# Altium footprint library mobinbyn-Connector.PcbLib: 82 footprints (part 3 of 6)
Each footprint in its own frame and in the unit in brackets; x right, y up, seen from the top. Pads: shape width x height; smd on the part's side, far side on the other; paste and mask are expansions set on the pad; w line width, h text height; cw(c..) or ccw(c..) is an arc to the next point about the centre after c.
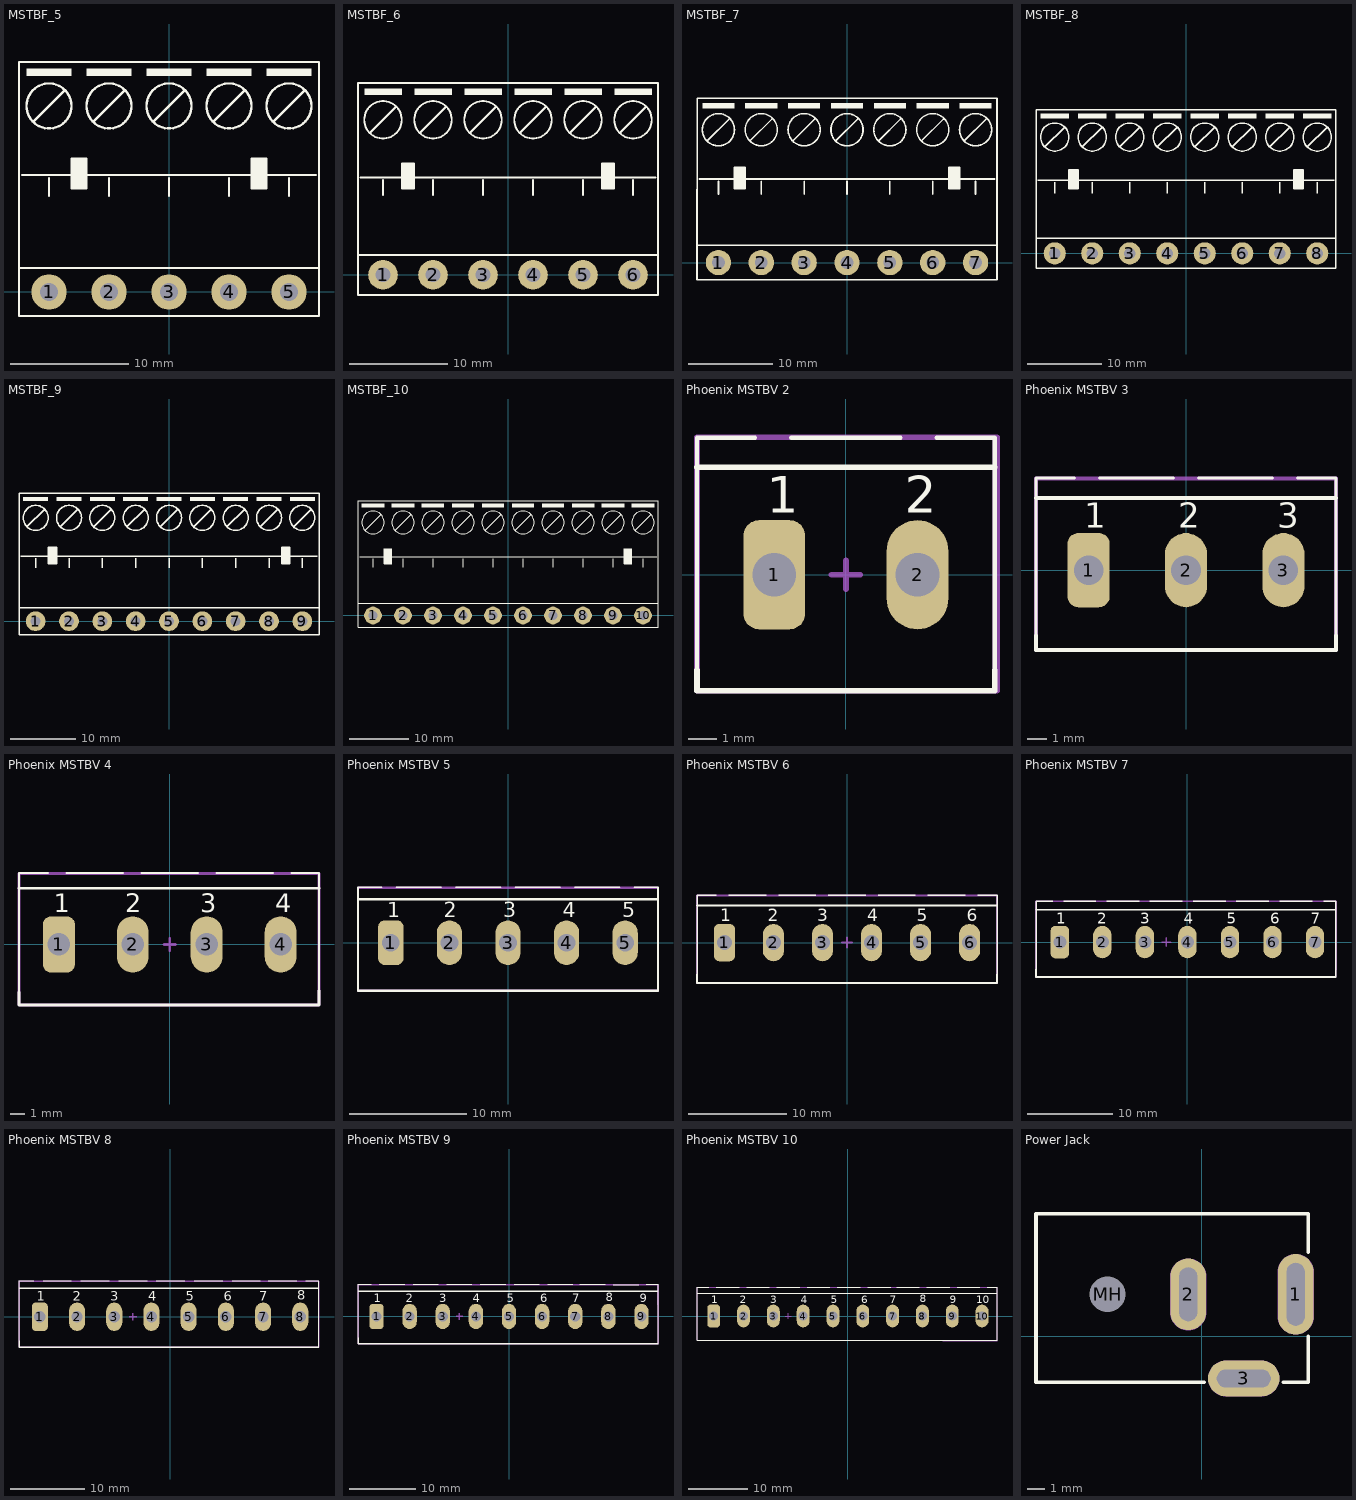
[diagram p2: the footprints below, top view; thin cyan lines are the x and y axes]

## MSTBF_5 [mm] "PHOENIX MSTB 2, 5-G, 5.08mm pitch"
pads (5):
  round 3 hole 1.5: 1(-10.16,0) 2(-5.08,0) 3(0,0) 4(5.08,0) 5(10.16,0)
Top Overlay:
  circle w0.2: c-10.16,15.748 r1.905
  circle w0.2: c-5.08,15.748 r1.905
  circle w0.2: c0,15.748 r1.905
  circle w0.2: c5.08,15.748 r1.905
  circle w0.2: c10.16,15.748 r1.905
  region: 1.905,18.923 -1.905,18.923 -1.905,18.288 1.905,18.288
  region: 6.985,18.923 3.175,18.923 3.175,18.288 6.985,18.288
  region: 12.065,18.923 8.255,18.923 8.255,18.288 12.065,18.288
  region: -8.255,18.923 -12.065,18.923 -12.065,18.288 -8.255,18.288
  region: -3.175,18.923 -6.985,18.923 -6.985,18.288 -3.175,18.288
  region: 8.255,11.303 6.985,11.303 6.985,8.763 8.255,8.763
  rectangle: -8.255,8.763 -6.985,11.303
  lines w0.2: -12.7,2.032 12.7,2.032 ; -12.446,9.906 12.446,9.906 ; -11.43,14.478 -8.89,17.018 ; -10.16,8.128 -10.16,9.618 ; -6.35,14.478 -3.81,17.018 ; -5.08,8.128 -5.08,9.618 ; -1.27,14.478 1.27,17.018 ; 0,8.128 0,9.618 ; 3.81,14.478 6.35,17.018 ; 5.08,8.128 5.08,9.618 ; 8.89,14.478 11.43,17.018 ; 10.16,8.128 10.16,9.618 ; -12.7,-2.032 12.7,-2.032 12.7,19.468 -12.7,19.468 -12.7,-2.032 ; -8.255,8.763 -8.255,11.303 -6.985,11.303 -6.985,8.763 -8.255,8.763 ; 6.985,8.763 6.985,11.303 8.255,11.303 8.255,8.763 6.985,8.763
3D body "PHOENIX_MSTB5w.stp": height 14.47, standoff -0.53, extent -12.7,1 12.7,19.2
3D body "PHOENIX_MSTB5.stp": height 8.6, standoff -3.5, extent -12.5,-2 12.5,10

## MSTBF_6 [mm] "PHOENIX MSTB 2, 5-G, 5.08mm pitch"
pads (6):
  round 3 hole 1.5: 1(-12.7,0) 2(-7.62,0) 3(-2.54,0) 4(2.54,0) 5(7.62,0) 6(12.7,0)
Top Overlay:
  circle w0.2: c-12.7,15.748 r1.905
  circle w0.2: c-7.62,15.748 r1.905
  circle w0.2: c-2.54,15.748 r1.905
  circle w0.2: c2.54,15.748 r1.905
  circle w0.2: c7.62,15.748 r1.905
  circle w0.2: c12.7,15.748 r1.905
  region: 4.445,18.923 0.635,18.923 0.635,18.288 4.445,18.288
  region: 9.525,18.923 5.715,18.923 5.715,18.288 9.525,18.288
  region: 14.605,18.923 10.795,18.923 10.795,18.288 14.605,18.288
  region: -5.715,18.923 -9.525,18.923 -9.525,18.288 -5.715,18.288
  region: -10.795,18.923 -14.605,18.923 -14.605,18.288 -10.795,18.288
  region: -0.635,18.923 -4.445,18.923 -4.445,18.288 -0.635,18.288
  region: 10.795,11.303 9.525,11.303 9.525,8.763 10.795,8.763
  rectangle: -10.795,8.763 -9.525,11.303
  lines w0.2: -15.24,2.032 15.24,2.032 ; -15.24,19.468 -15.24,-2.032 15.24,-2.032 15.24,19.468 -15.21,19.468 ; -14.986,9.906 14.986,9.906 ; -13.97,14.478 -11.43,17.018 ; -12.7,8.128 -12.7,9.618 ; -8.89,14.478 -6.35,17.018 ; -7.62,8.128 -7.62,9.618 ; -3.81,14.478 -1.27,17.018 ; -2.54,8.128 -2.54,9.618 ; 1.27,14.478 3.81,17.018 ; 2.54,8.128 2.54,9.618 ; 6.35,14.478 8.89,17.018 ; 7.62,8.128 7.62,9.618 ; 11.43,14.478 13.97,17.018 ; 12.7,8.128 12.7,9.618 ; -10.795,8.763 -10.795,11.303 -9.525,11.303 -9.525,8.763 -10.795,8.763 ; 9.525,8.763 9.525,11.303 10.795,11.303 10.795,8.763 9.525,8.763
3D body "PHOENIX_MSTB6.stp": height 8.6, standoff -3.5, extent -15,-2 15,10
3D body "PHOENIX_MSTB6W.stp": height 15.07, standoff 0.07, extent -15.18,1 15.3,19.2

## MSTBF_7 [mm] "PHOENIX MSTB 2, 5-G, 5.08mm pitch"
pads (7):
  round 3 hole 1.5: 1(-15.24,0) 2(-10.16,0) 3(-5.08,0) 4(0,0) 5(5.08,0) 6(10.16,0) 7(15.24,0)
Top Overlay:
  circle w0.2: c-15.24,15.748 r1.905
  circle w0.2: c-10.16,15.748 r1.905
  circle w0.2: c-5.08,15.748 r1.905
  circle w0.2: c0,15.748 r1.905
  circle w0.2: c5.08,15.748 r1.905
  circle w0.2: c10.16,15.748 r1.905
  circle w0.2: c15.24,15.748 r1.905
  region: 13.335,11.303 12.065,11.303 12.065,8.763 13.335,8.763
  region: 6.985,18.923 3.175,18.923 3.175,18.288 6.985,18.288
  region: 12.065,18.923 8.255,18.923 8.255,18.288 12.065,18.288
  rectangle: -13.335,8.763 -12.065,11.303
  region: 17.145,18.923 13.335,18.923 13.335,18.288 17.145,18.288
  region: -3.175,18.923 -6.985,18.923 -6.985,18.288 -3.175,18.288
  region: -8.255,18.923 -12.065,18.923 -12.065,18.288 -8.255,18.288
  region: -13.335,18.923 -17.145,18.923 -17.145,18.288 -13.335,18.288
  region: 1.905,18.923 -1.905,18.923 -1.905,18.288 1.905,18.288
  lines w0.2: -17.78,2.032 17.78,2.032 ; -17.526,9.906 17.526,9.906 ; -16.51,14.478 -13.97,17.018 ; -15.24,8.128 -15.24,9.618 ; -11.43,14.478 -8.89,17.018 ; -10.16,8.128 -10.16,9.618 ; -6.35,14.478 -3.81,17.018 ; -5.08,8.128 -5.08,9.618 ; -1.27,14.478 1.27,17.018 ; 0,8.128 0,9.618 ; 3.81,14.478 6.35,17.018 ; 5.08,8.128 5.08,9.618 ; 8.89,14.478 11.43,17.018 ; 10.16,8.128 10.16,9.618 ; 13.97,14.478 16.51,17.018 ; 15.24,8.128 15.24,9.618 ; -17.78,-2.032 17.78,-2.032 17.78,19.468 -17.75,19.468 -17.78,-2.032 ; -13.335,8.763 -12.065,8.763 -12.065,11.303 -13.335,11.303 -13.335,8.763 ; 12.065,8.763 12.065,11.303 13.335,11.303 13.335,8.763 12.065,8.763
3D body "PHOENIX_MSTB6.stp": height 8.6, standoff -3.5, extent -17.5,-2 17.5,10
3D body "PHOENIX_MSTB7W.stp": height 15.07, standoff 0.07, extent -17.86,1 17.7,19.2

## MSTBF_8 [mm] "PHOENIX MSTB 2, 5-G, 5.08mm pitch"
pads (8):
  round 3 hole 1.5: 1(-17.78,0) 2(-12.7,0) 3(-7.62,0) 4(-2.54,0) 5(2.54,0) 6(7.62,0) 7(12.7,0) 8(17.78,0)
Top Overlay:
  circle w0.2: c17.78,15.748 r1.905
  circle w0.2: c12.7,15.748 r1.905
  circle w0.2: c7.62,15.748 r1.905
  circle w0.2: c2.54,15.748 r1.905
  circle w0.2: c-2.54,15.748 r1.905
  circle w0.2: c-7.62,15.748 r1.905
  circle w0.2: c-12.7,15.748 r1.905
  circle w0.2: c-17.78,15.748 r1.905
  region: 15.875,11.303 14.605,11.303 14.605,8.763 15.875,8.763
  region: -14.605,11.303 -15.875,11.303 -15.875,8.763 -14.605,8.763
  region: 4.445,18.923 0.635,18.923 0.635,18.288 4.445,18.288
  region: -15.875,18.923 -19.685,18.923 -19.685,18.288 -15.875,18.288
  region: -10.795,18.923 -14.605,18.923 -14.605,18.288 -10.795,18.288
  region: -5.715,18.923 -9.525,18.923 -9.525,18.288 -5.715,18.288
  region: -0.635,18.923 -4.445,18.923 -4.445,18.288 -0.635,18.288
  region: 19.685,18.923 15.875,18.923 15.875,18.288 19.685,18.288
  region: 14.605,18.923 10.795,18.923 10.795,18.288 14.605,18.288
  region: 9.525,18.923 5.715,18.923 5.715,18.288 9.525,18.288
  lines w0.2: -20.32,2.032 20.32,2.032 ; -20.066,9.906 20.066,9.906 ; -19.05,14.478 -16.51,17.018 ; -17.78,8.128 -17.78,9.618 ; -13.97,14.478 -11.43,17.018 ; -12.7,8.128 -12.7,9.618 ; -8.89,14.478 -6.35,17.018 ; -7.62,8.128 -7.62,9.618 ; -3.81,14.478 -1.27,17.018 ; -2.54,8.128 -2.54,9.618 ; 1.27,14.478 3.81,17.018 ; 2.54,8.128 2.54,9.618 ; 6.35,14.478 8.89,17.018 ; 7.62,8.128 7.62,9.618 ; 11.43,14.478 13.97,17.018 ; 12.7,8.128 12.7,9.618 ; 16.51,14.478 19.05,17.018 ; 17.78,8.128 17.78,9.618 ; -20.32,-2.032 20.32,-2.032 20.32,19.468 -20.32,19.468 -20.32,-2.032 ; -15.875,8.763 -15.875,11.303 -14.605,11.303 -14.605,8.763 -15.875,8.763 ; 14.605,8.763 15.875,8.763 15.875,11.303 14.605,11.303 14.605,8.763
3D body "PHOENIX_MSTB8.stp": height 8.6, standoff -3.5, extent -20,-2 20,10
3D body "PHOENIX_MSTB8W.stp": height 15.07, standoff 0.07, extent -20.34,1 20.3,19.2

## MSTBF_9 [mm] "PHOENIX MSTB 2, 5-G, 5.08mm pitch"
pads (9):
  round 3 hole 1.5: 1(-20.32,0) 2(-15.24,0) 3(-10.16,0) 4(-5.08,0) 5(0,0) 6(5.08,0) 7(10.16,0) 8(15.24,0) 9(20.32,0)
Top Overlay:
  circle w0.2: c-20.32,15.748 r1.905
  circle w0.2: c20.32,15.748 r1.905
  circle w0.2: c15.24,15.748 r1.905
  circle w0.2: c10.16,15.748 r1.905
  circle w0.2: c5.08,15.748 r1.905
  circle w0.2: c0,15.748 r1.905
  circle w0.2: c-5.08,15.748 r1.905
  circle w0.2: c-10.16,15.748 r1.905
  circle w0.2: c-15.24,15.748 r1.905
  region: -18.415,18.923 -22.225,18.923 -22.225,18.288 -18.415,18.288
  region: -17.145,11.303 -18.415,11.303 -18.415,8.763 -17.145,8.763
  region: 18.415,11.303 17.145,11.303 17.145,8.763 18.415,8.763
  region: 6.985,18.923 3.175,18.923 3.175,18.288 6.985,18.288
  region: -13.335,18.923 -17.145,18.923 -17.145,18.288 -13.335,18.288
  region: -8.255,18.923 -12.065,18.923 -12.065,18.288 -8.255,18.288
  region: -3.175,18.923 -6.985,18.923 -6.985,18.288 -3.175,18.288
  region: 1.905,18.923 -1.905,18.923 -1.905,18.288 1.905,18.288
  region: 22.225,18.923 18.415,18.923 18.415,18.288 22.225,18.288
  region: 17.145,18.923 13.335,18.923 13.335,18.288 17.145,18.288
  region: 12.065,18.923 8.255,18.923 8.255,18.288 12.065,18.288
  lines w0.2: -22.86,2.032 22.86,2.032 ; -22.606,9.906 22.606,9.906 ; -21.59,14.478 -19.05,17.018 ; -20.32,8.128 -20.32,9.618 ; -16.51,14.478 -13.97,17.018 ; -15.24,8.128 -15.24,9.618 ; -11.43,14.478 -8.89,17.018 ; -10.16,8.128 -10.16,9.618 ; -6.35,14.478 -3.81,17.018 ; -5.08,8.128 -5.08,9.618 ; -1.27,14.478 1.27,17.018 ; 0,8.128 0,9.618 ; 3.81,14.478 6.35,17.018 ; 5.08,8.128 5.08,9.618 ; 8.89,14.478 11.43,17.018 ; 10.16,8.128 10.16,9.618 ; 13.97,14.478 16.51,17.018 ; 15.24,8.128 15.24,9.618 ; 19.05,14.478 21.59,17.018 ; 20.32,8.128 20.32,9.618 ; -22.86,-2.032 -22.86,19.468 22.86,19.468 22.86,-2.032 -22.86,-2.032 ; -18.415,8.763 -18.415,11.303 -17.145,11.303 -17.145,8.763 -18.415,8.763 ; 17.145,8.763 18.415,8.763 18.415,11.303 17.145,11.303 17.145,8.763
3D body "PHOENIX_MSTB9W.stp": height 15.07, standoff 0.07, extent -22.82,1 22.9,19.2
3D body "PHOENIX_MSTB9.stp": height 8.6, standoff -3.5, extent -22.5,-2 22.5,10

## MSTBF_10 [mm] "PHOENIX MSTB 2, 5-G, 5.08mm pitch"
pads (10):
  round 3 hole 1.5: 1(-22.86,0) 2(-17.78,0) 3(-12.7,0) 4(-7.62,0) 5(-2.54,0) 6(2.54,0) 7(7.62,0) 8(12.7,0) 9(17.78,0) 10(22.86,0)
Top Overlay:
  circle w0.2: c-17.78,15.748 r1.905
  circle w0.2: c-22.86,15.748 r1.905
  circle w0.2: c22.86,15.748 r1.905
  circle w0.2: c17.78,15.748 r1.905
  circle w0.2: c12.7,15.748 r1.905
  circle w0.2: c7.62,15.748 r1.905
  circle w0.2: c2.54,15.748 r1.905
  circle w0.2: c-2.54,15.748 r1.905
  circle w0.2: c-7.62,15.748 r1.905
  circle w0.2: c-12.7,15.748 r1.905
  region: -20.955,18.923 -24.765,18.923 -24.765,18.288 -20.955,18.288
  region: -15.875,18.923 -19.685,18.923 -19.685,18.288 -15.875,18.288
  region: -19.685,11.303 -20.955,11.303 -20.955,8.763 -19.685,8.763
  region: 20.955,11.303 19.685,11.303 19.685,8.763 20.955,8.763
  region: 9.525,18.923 5.715,18.923 5.715,18.288 9.525,18.288
  region: -10.795,18.923 -14.605,18.923 -14.605,18.288 -10.795,18.288
  region: -5.715,18.923 -9.525,18.923 -9.525,18.288 -5.715,18.288
  region: -0.635,18.923 -4.445,18.923 -4.445,18.288 -0.635,18.288
  region: 4.445,18.923 0.635,18.923 0.635,18.288 4.445,18.288
  region: 24.765,18.923 20.955,18.923 20.955,18.288 24.765,18.288
  region: 19.685,18.923 15.875,18.923 15.875,18.288 19.685,18.288
  region: 14.605,18.923 10.795,18.923 10.795,18.288 14.605,18.288
  lines w0.2: -25.4,2.032 25.4,2.032 ; -25.146,9.906 25.146,9.906 ; -24.13,14.478 -21.59,17.018 ; -22.86,8.128 -22.86,9.618 ; -19.05,14.478 -16.51,17.018 ; -17.78,8.128 -17.78,9.618 ; -13.97,14.478 -11.43,17.018 ; -12.7,8.128 -12.7,9.618 ; -8.89,14.478 -6.35,17.018 ; -7.62,8.128 -7.62,9.618 ; -3.81,14.478 -1.27,17.018 ; -2.54,8.128 -2.54,9.618 ; 1.27,14.478 3.81,17.018 ; 2.54,8.128 2.54,9.618 ; 6.35,14.478 8.89,17.018 ; 7.62,8.128 7.62,9.618 ; 11.43,14.478 13.97,17.018 ; 12.7,8.128 12.7,9.618 ; 16.51,14.478 19.05,17.018 ; 17.78,8.128 17.78,9.618 ; 21.59,14.478 24.13,17.018 ; 22.86,8.128 22.86,9.618 ; -25.4,-2.032 -25.4,19.468 25.4,19.468 25.4,-2.032 -25.4,-2.032 ; -20.955,8.763 -20.955,11.303 -19.685,11.303 -19.685,8.763 -20.955,8.763 ; 19.685,8.763 20.955,8.763 20.955,11.303 19.685,11.303 19.685,8.763
3D body "PHOENIX_MSTB10.stp": height 8.6, standoff -3.5, extent -25,-2 25,10
3D body "PHOENIX_MSTB10W.stp": height 15.07, standoff 0.07, extent -25.4,1 25.4,19.2

## Phoenix MSTBV 2 [mil] "Header, Nominal current: 12 A Rated voltage (III/2): 320 V Number of positions: 2 Pitch: 5mm Color: green Contact surface: Tin Assembly: Soldering"
height 338.58
pads (2):
  rrect50% 85x150 hole 60: 1(-98.43,0)
  oval 85x150 hole 60: 2(98.43,0)
Top Overlay:
  lines w6: -204.72,-131.46 -204.72,188.27 -125,188.27 ; -75,188.27 75,188.27 ; 125,188.27 204.72,188.27 204.72,-131.46
  lines w7.87: -204.72,-131.46 -204.72,-159.45 204.72,-159.45 204.72,-131.46 ; -204.72,147.64 204.72,147.64
  text "2" at 80.87,85.24 h50
  text "1" at -109.13,85.24 h50
Mechanical 13:
  lines w6: -204.72,-131.46 -204.72,188.27 -125,188.27 ; -75,188.27 75,188.27 ; 125,188.27 204.72,188.27 204.72,-131.46
Mechanical 15:
  lines w7.87: -19.68,0 19.68,0 ; 0,-19.68 0,19.69 ; -204.72,-159.45 -204.72,188.98 -203.74,188.98 207.68,188.98 207.68,-159.45 -204.72,-159.45
3D body "1753437.stEp": height 473.44, standoff -152.54, extent -196.85,-151.57 196.85,187.01

## Phoenix MSTBV 3 [mil] "Header, Nominal current: 12 A Rated voltage (III/2): 320 V Number of positions: 3 Pitch: 5mm Color: green Contact surface: Tin Assembly: Soldering"
height 338.58
pads (3):
  rrect50% 85x150 hole 60: 1(-196.85,0)
  oval 85x150 hole 60: 2(0,0) 3(196.85,0)
Top Overlay:
  lines w6: -303.15,-131.85 -303.15,186.3 -225,186.3 ; -175,186.3 -25,186.3 ; 25,186.3 175,186.3 ; 225,186.3 303.15,186.3 303.15,-131.85
  lines w7.87: -303.15,-131.85 -303.15,-161.42 303.15,-161.42 303.15,-131.85 ; -303.15,145.67 303.15,145.67
  text "3" at 184.8,85.24 h50
  text "2" at -15.2,85.24 h50
  text "1" at -205.2,85.24 h50
Mechanical 13:
  lines w6: -303.15,-131.85 -303.15,186.3 -225,186.3 ; -175,186.3 -25,186.3 ; 25,186.3 175,186.3 ; 225,186.3 303.15,186.3 303.15,-131.85
Mechanical 15:
  lines w7.87: -303.15,-161.42 -303.15,185.04 303.15,185.04 303.15,-161.42 -299.21,-161.42 -303.15,-161.42
3D body "1753453.stEp": height 473.44, standoff -152.54, extent -295.27,-153.54 295.28,185.04

## Phoenix MSTBV 4 [mil] "Header, Nominal current: 12 A Rated voltage (III/2): 320 V Number of positions: 4 Pitch: 5mm Color: green Contact surface: Tin Assembly: Soldering"
height 338.58
pads (4):
  rrect50% 85x150 hole 60: 1(-295.28,0)
  oval 85x150 hole 60: 2(-98.43,0) 3(98.43,0) 4(295.28,0)
Top Overlay:
  lines w6: -401.57,-126.34 -401.57,190.24 -325,190.24 ; -275,190.24 -125,190.24 ; -75,190.24 75,190.24 ; 125,190.24 275,190.24 ; 325,190.24 397.64,190.24 397.64,-122.4
  lines w7.87: -401.57,-126.34 -401.57,-161.42 397.64,-161.42 397.64,-122.4 ; -401.57,149.61 397.64,149.61
  text "1" at -309.13,85.24 h50
  text "2" at -119.13,85.24 h50
  text "3" at 80.87,85.24 h50
  text "4" at 280.87,85.24 h50
Mechanical 13:
  lines w6: -401.57,-126.34 -401.57,190.24 -325,190.24 ; -275,190.24 -125,190.24 ; -75,190.24 75,190.24 ; 125,190.24 275,190.24 ; 325,190.24 397.64,190.24 397.64,-122.4
Mechanical 15:
  lines w7.87: -15.75,0 15.75,0 ; 0,-15.75 0,15.75 ; -401.57,-161.42 -401.57,188.98 397.64,188.98 397.64,-161.42 -401.57,-161.42
3D body "1753479.stEp": height 472.44, standoff -153.54, extent -393.7,-152.56 393.7,186.02

## Phoenix MSTBV 5 [mil] "Header, Nominal current: 12 A Rated voltage (III/2): 320 V Number of positions: 5 Pitch: 5mm Color: green Contact surface: Tin Assembly: Soldering"
height 338.58
pads (5):
  rrect50% 85x150 hole 60: 1(-393.7,0)
  oval 85x150 hole 60: 2(-196.85,0) 3(0,0) 4(196.85,0) 5(393.7,0)
Top Overlay:
  lines w6: -503.94,-132.64 -503.94,186.3 -425,186.3 ; -375,186.3 -225,186.3 ; -175,186.3 -25,186.3 ; 25,186.3 175,186.3 ; 225,186.3 375,186.3 ; 425,186.3 503.94,186.3 503.94,-132.64
  lines w7.87: -503.94,-132.64 -503.94,-161.42 503.94,-161.42 503.94,-132.64 ; -503.94,145.67 503.94,145.67
  text "1" at -406.06,86.22 h50
  text "2" at -216.06,86.22 h50
  text "3" at -16.06,86.22 h50
  text "4" at 183.94,86.22 h50
  text "5" at 383.94,86.22 h50
Mechanical 13:
  lines w6: -503.94,-132.64 -503.94,186.3 -425,186.3 ; -375,186.3 -225,186.3 ; -175,186.3 -25,186.3 ; 25,186.3 175,186.3 ; 225,186.3 375,186.3 ; 425,186.3 503.94,186.3 503.94,-132.64
Mechanical 15:
  lines w7.87: -503.94,-161.42 -503.94,185.04 503.94,185.04 503.94,-161.42 -503.94,-161.42
3D body "1753495.stEp": height 472.44, standoff -153.54, extent -492.13,-153.54 492.12,185.04

## Phoenix MSTBV 6 [mil] "Header, Nominal current: 12 A Rated voltage (III/2): 320 V Number of positions: 6 Pitch: 5mm Color: green Contact surface: Tin Assembly: Soldering"
height 338.58
pads (6):
  rrect50% 85x150 hole 60: 1(-492.13,0)
  oval 85x150 hole 60: 2(-295.28,0) 3(-98.43,0) 4(98.43,0) 5(295.28,0) 6(492.13,0)
Top Overlay:
  lines w6: -602.36,-127.13 -602.36,190.24 -525,190.24 ; -475,190.24 -325,190.24 ; -275,190.24 -125,190.24 ; -75,190.24 75,190.24 ; 125,190.24 275,190.24 ; 325,190.24 475,190.24 ; 525,190.24 602.36,190.24 602.36,-127.13
  lines w7.87: -602.36,-127.13 -602.36,-161.42 602.36,-161.42 602.36,-127.13 ; -602.36,149.61 602.36,149.61
  text "6" at 480.87,85.24 h50
  text "5" at 280.87,85.24 h50
  text "4" at 80.87,85.24 h50
  text "3" at -119.13,85.24 h50
  text "2" at -319.13,85.24 h50
  text "1" at -509.13,85.24 h50
Mechanical 13:
  lines w6: -602.36,-127.13 -602.36,190.24 -525,190.24 ; -475,190.24 -325,190.24 ; -275,190.24 -125,190.24 ; -75,190.24 75,190.24 ; 125,190.24 275,190.24 ; 325,190.24 475,190.24 ; 525,190.24 602.36,190.24 602.36,-127.13
Mechanical 15:
  lines w7.87: -19.68,0 19.68,0 ; 0,-19.68 0,19.68 ; -602.36,-161.42 602.36,-161.42 602.36,188.98 -602.36,188.98 -602.36,-161.42
3D body "1753518.stEp": height 472.44, standoff -153.54, extent -590.55,-153.54 590.55,185.04

## Phoenix MSTBV 7 [mil] "Header, Nominal current: 12 A Rated voltage (III/2): 320 V Number of positions: 6 Pitch: 5mm Color: green Contact surface: Tin Assembly: Soldering"
height 338.58
pads (7):
  rrect50% 85x150 hole 60: 1(-590.55,0)
  oval 85x150 hole 60: 2(-393.7,0) 3(-196.85,0) 4(0,0) 5(196.85,0) 6(393.7,0) 7(590.55,0)
Top Overlay:
  lines w6: -700.79,-127.13 -700.79,190.24 -623.43,190.24 ; -573.43,190.24 -423.43,190.24 ; -373.43,190.24 -223.43,190.24 ; -173.43,190.24 -23.43,190.24 ; 26.57,190.24 176.57,190.24 ; 426.57,190.24 576.57,190.24 ; 630.57,190 686.57,190 686.57,-161.42 ; 226.57,190.24 376.57,190.24 226.57,190.24
  lines w7.87: -700.79,-127.13 -700.79,-161.42 503.94,-161.42 686.57,-161.42 ; -700.79,149.61 684.57,150
  text "5" at 182.44,85.24 h50
  text "4" at -17.56,85.24 h50
  text "3" at -217.56,85.24 h50
  text "2" at -417.56,85.24 h50
  text "1" at -607.56,85.24 h50
  text "7" at 571.57,85 h50
  text "6" at 382.44,85.24 h50
Mechanical 13:
  lines w6: -700.79,-127.13 -700.79,190.24 -623.43,190.24 ; -573.43,190.24 -423.43,190.24 ; -373.43,190.24 -223.43,190.24 ; -173.43,190.24 -23.43,190.24 ; 26.57,190.24 176.57,190.24 ; 226.57,190.24 376.57,190.24 ; 426.57,190.24 687.57,190.24 687.57,-127.13
Mechanical 15:
  lines w7.87: -118.11,0 -78.74,0 ; -98.43,-19.68 -98.43,19.68 ; -700.79,-161.42 686.57,-161.42 686.57,188.98 -700.79,188.98 -700.79,-161.42
3D body "1753518.stEp": height 472.44, standoff -153.54, extent -688.97,-153.54 492.13,185.04
3D body "1753437.stEp": height 473.44, standoff -152.54, extent 294.73,-154 688.42,184.58

## Phoenix MSTBV 8 [mil] "Header, Nominal current: 12 A Rated voltage (III/2): 320 V Number of positions: 6 Pitch: 5mm Color: green Contact surface: Tin Assembly: Soldering"
height 338.58
pads (8):
  rrect50% 85x150 hole 60: 1(-688.98,0)
  oval 85x150 hole 60: 2(-492.13,0) 3(-295.28,0) 4(-98.43,0) 5(98.43,0) 6(295.28,0) 7(492.13,0) 8(688.98,0)
Top Overlay:
  lines w6: -799.21,-127.13 -799.21,190.24 -721.85,190.24 ; -671.85,190.24 -521.85,190.24 ; -471.85,190.24 -321.85,190.24 ; -271.85,190.24 -121.85,190.24 ; -71.85,190.24 78.15,190.24 ; 128.15,190.24 278.15,190.24 ; 328.15,190.24 478.15,190.24 ; 519.15,190 669.15,190 ; 718.15,190.24 788.15,190.24 788.15,-161.42
  lines w7.87: -799.21,-127.13 -799.21,-161.42 405.51,-161.42 788.15,-161.42 ; -799.21,149.61 785.15,150.06
  text "6" at 284.02,85.24 h50
  text "7" at 473.15,85 h50
  text "1" at -705.98,85.24 h50
  text "2" at -515.98,85.24 h50
  text "3" at -315.98,85.24 h50
  text "4" at -115.98,85.24 h50
  text "5" at 84.02,85.24 h50
  text "8" at 672.15,90 h50
Mechanical 13:
  lines w6: -799.21,-127.13 -799.21,190.24 -721.85,190.24 ; -671.85,190.24 -521.85,190.24 ; -471.85,190.24 -321.85,190.24 ; -271.85,190.24 -121.85,190.24 ; -71.85,190.24 78.15,190.24 ; 128.15,190.24 278.15,190.24 ; 328.15,190.24 787.15,190.24 787.15,-127.13
Mechanical 15:
  lines w7.87: -216.54,0 -177.17,0 ; -196.85,-19.68 -196.85,19.68 ; -799.21,-161.42 -799.21,188.98 787.15,188.98 787.15,-161.42 -799.21,-161.42
3D body "1753518.stEp": height 472.44, standoff -153.54, extent -787.4,-153.54 393.7,185.04
3D body "1753453.stEp": height 473.44, standoff -152.54, extent 196.85,-153.54 787.4,185.04

## Phoenix MSTBV 9 [mil] "Header, Nominal current: 12 A Rated voltage (III/2): 320 V Number of positions: 6 Pitch: 5mm Color: green Contact surface: Tin Assembly: Soldering"
height 338.58
pads (9):
  rrect50% 85x150 hole 60: 1(-787.4,0)
  oval 85x150 hole 60: 2(-590.55,0) 3(-393.7,0) 4(-196.85,0) 5(0,0) 6(196.85,0) 7(393.7,0) 8(590.55,0) 9(787.4,0)
Top Overlay:
  lines w6: -897.64,-127.13 -897.64,190.24 -820.28,190.24 ; -770.28,190.24 -620.28,190.24 ; -570.28,190.24 -420.28,190.24 ; -370.28,190.24 -220.28,190.24 ; -170.28,190.24 -20.28,190.24 ; 29.72,190.24 179.72,190.24 ; 229.72,190.24 379.72,190.24 ; 420.72,190 570.72,190 ; 620.72,189 770.72,189 ; 816.72,190.24 885.72,190.24 885.72,-161.42
  lines w7.87: -897.64,-127.13 -897.64,-161.42 307.09,-161.42 885.72,-161.42 ; -897.64,149.61 880.72,150.11
  text "6" at 185.59,85.24 h50
  text "7" at 374.72,85 h50
  text "1" at -804.41,85.24 h50
  text "2" at -614.41,85.24 h50
  text "3" at -414.41,85.24 h50
  text "4" at -214.41,85.24 h50
  text "5" at -14.41,85.24 h50
  text "8" at 573.72,90 h50
  text "9" at 776.14,85.24 h50
Mechanical 13:
  lines w6: -897.64,-127.13 -897.64,190.24 -820.28,190.24 ; -770.28,190.24 -620.28,190.24 ; -570.28,190.24 -420.28,190.24 ; -370.28,190.24 -220.28,190.24 ; -170.28,190.24 -20.28,190.24 ; 29.72,190.24 179.72,190.24 ; 229.72,190.24 884.72,190.24 884.72,68.87 885.72,69.87 885.72,-161.42
Mechanical 15:
  lines w7.87: -314.96,0 -275.59,0 ; -295.28,-19.68 -295.28,19.68 ; -897.64,-161.42 -897.64,188.98 885.72,188.98 885.72,-161.42 -897.64,-161.42
3D body "1753518.stEp": height 472.44, standoff -153.54, extent -885.82,-153.54 295.28,185.04
3D body "1753479.stEp": height 472.44, standoff -153.54, extent 98.43,-153.56 885.83,185.03

## Phoenix MSTBV 10 [mil] "Header, Nominal current: 12 A Rated voltage (III/2): 320 V Number of positions: 6 Pitch: 5mm Color: green Contact surface: Tin Assembly: Soldering"
height 338.58
pads (11):
  rrect50% 85x150 hole 60: 1(-885.83,0)
  oval 85x150 hole 60: 2(-688.98,0) 3(-492.13,0) 3(492.13,0) 4(-295.28,0) 5(-98.43,0) 6(98.43,0) 7(295.28,0) 8(492.13,0) 9(688.98,0) 10(885.83,0)
Top Overlay:
  lines w6: -996.06,-127.13 -996.06,190.24 -918.7,190.24 ; -868.7,190.24 -718.7,190.24 ; -668.7,190.24 -518.7,190.24 ; -468.7,190.24 -318.7,190.24 ; -268.7,190.24 -118.7,190.24 ; -68.7,190.24 81.3,190.24 ; 131.3,190.24 281.3,190.24 ; 322.3,190 472.3,190 ; 521.3,190.24 671.3,190.24 ; 720.3,190.47 870.3,190.47 ; 918.3,190 984.3,190 984.3,-161.42
  lines w7.87: -996.06,-127.13 -996.06,-161.42 208.66,-161.42 984.3,-161.42 ; -996.06,149.61 981.3,150.17
  text "6" at 87.17,85.24 h50
  text "7" at 276.3,85 h50
  text "1" at -902.83,85.24 h50
  text "2" at -712.83,85.24 h50
  text "3" at -512.83,85.24 h50
  text "4" at -312.83,85.24 h50
  text "5" at -112.83,85.24 h50
  text "8" at 475.3,90 h50
  text "9" at 671.42,85.24 h50
  text "10" at 847.3,85 h50
Mechanical 13:
  lines w6: -996.06,-127.13 -996.06,190.24 -918.7,190.24 ; -868.7,190.24 -718.7,190.24 ; -668.7,190.24 -518.7,190.24 ; -468.7,190.24 -318.7,190.24 ; -268.7,190.24 -118.7,190.24 ; -68.7,190.24 81.3,190.24 ; 131.3,190.24 984.3,190.24 984.3,-164 627.17,-164
Mechanical 15:
  lines w7.87: -413.39,0 -374.02,0 ; -393.7,-19.68 -393.7,19.68 ; -996.06,-161.42 -996.06,188.98 984.3,188.98 984.3,-161.42 -996.06,-161.42
3D body "1753518.stEp": height 472.44, standoff -153.54, extent -984.25,-153.54 196.85,185.04
3D body "1753495.stEp": height 472.44, standoff -153.54, extent 0,-153.54 984.25,185.04

## Power Jack [mm] "Power Adaptor Jack"
pads (4):
  oval 2x4.5 hole 1 slot 3.5 at 90 deg: 1(5.25,2.35)
  oval 2x4 hole 1 slot 3 at 90 deg: 2(-0.75,2.35)
  oval 4x2 hole 1 slot 3 at 0 deg: 3(2.35,-2.35)
  round 1.9 hole 2: MH(-5.25,2.35)
Top Overlay:
  lines w0.2: 0.15,-2.55 -9.25,-2.55 -9.25,6.85 5.95,6.85 5.95,4.7 ; 4.55,-2.55 5.95,-2.55 5.95,0
Mechanical 1:
  lines w1: -0.75,1.35 -0.75,3.35 ; 1.35,-2.35 3.35,-2.35 ; 5.25,1.1 5.25,3.6
Mechanical 2:
  lines w2.016: -0.75,1.35 -0.75,3.35 ; 1.35,-2.35 3.35,-2.35 ; 5.25,1.1 5.25,3.6
3D body "SW3dPS-PowerJack-2.5x5.7mm.STEP": height 11, standoff -3.5, extent -9.25,-2.55 5.95,6.85